# Altium footprint library AD常用3D封装.PCBLIB: 342 footprints (part 16 of 22)
Each footprint in its own frame and in the unit in brackets; x right, y up, seen from the top. Pads: shape width x height; smd on the part's side, far side on the other; paste and mask are expansions set on the pad; w line width, h text height; cw(c..) or ccw(c..) is an arc to the next point about the centre after c.
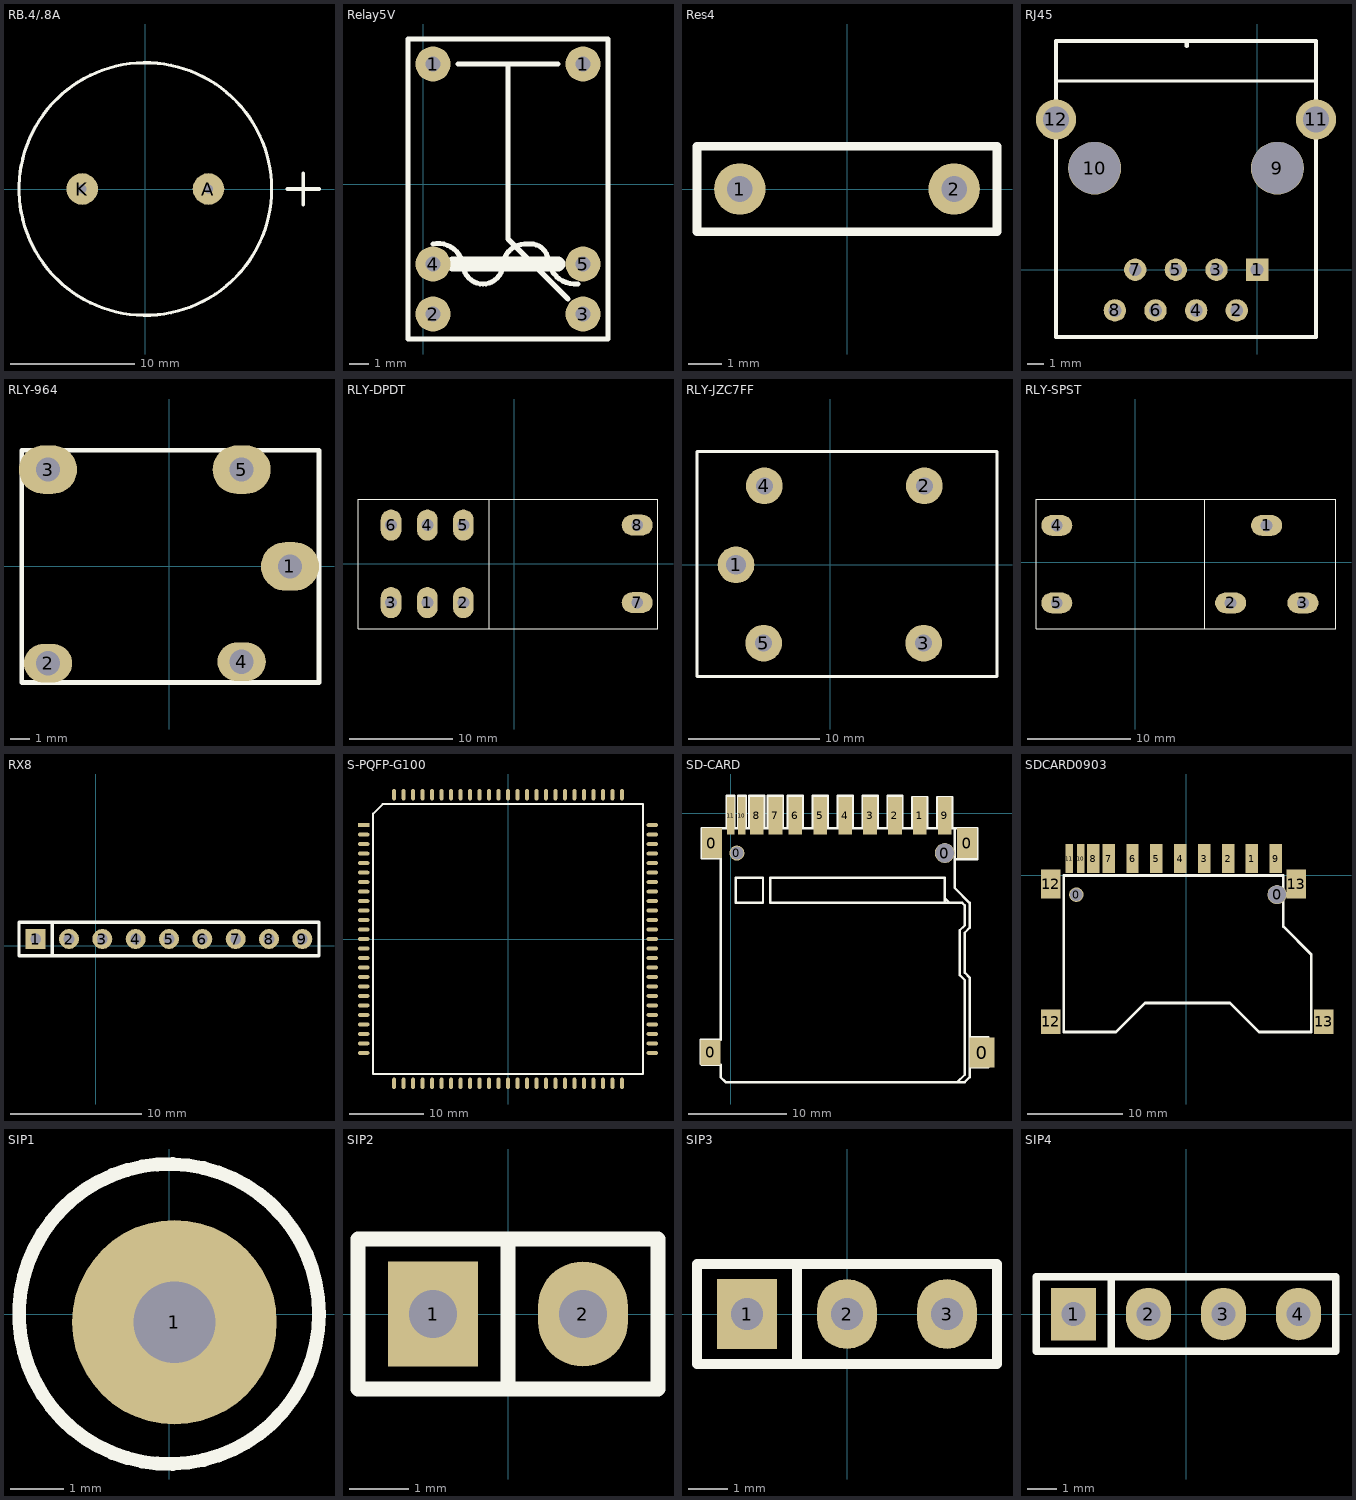
[diagram p15: the footprints below, top view; thin cyan lines are the x and y axes]

## RB.4/.8A [mil]
pads (2):
  round 100 hole 28: A(200,0) K(-200,0)
TopOverlay:
  circle w10: c0,0 r400
  lines w12: 450,0 550,0 ; 500,-50 500,50

## Relay5V [mil]
pads (6):
  round 70 hole 30: 1(20,240) 1(320,240) 2(20,-260) 3(320,-260) 4(20,-160) 5(320,-160)
TopOverlay:
  lines w10: 20,-120 cw(c30,-170) 80,-160 ccw(c120,-160) 120,-200 ccw(c120,-160) 160,-160 cw(c205,-165) 210,-120 cw(c215,-155) 250,-150 ccw(c305,-145) 310,-200 ; 70,240 270,240 ; 170,240 170,-110 290,-230 ; -30,-310 370,-310 370,290 -30,290 -30,-310
  lines w30: 60,-160 270,-160

## Res4 [mil]
pads (2):
  round 60 hole 30: 1(-125,0) 2(125,0)
TopOverlay:
  lines w10: -175,-50 -175,50 175,50 175,-50 -175,-50
3D body: height 79.62, standoff -74.8, extent -134.99,-36.23 135,36.24

## RJ45 [mil]
pads (12):
  rect 55x55 hole 31.5: 1(0,0)
  round 55 hole 31.5: 2(-50,-100) 3(-100,0) 4(-150,-100) 5(-200,0) 6(-250,-100) 7(-300,0) 8(-350,-100)
  round 130 hole 127.95 unplated: 9(50,250) 10(-400,250)
  round 98.42 hole 62.99: 11(145,370) 12(-495,370)
TopOverlay:
  lines w8: -488.19,464.57 141.73,464.57
  lines w10: -495,-165.35 144.65,-165.35 145,-165 145,370 145,562.99 -495,562.99 -495,370 -495,-165 ; -173.23,551.18 -173.23,559.06
3D body: height 127.85, standoff -555.12, extent -490,-172.17 139.92,556.17

## RLY-964 [mil]
pads (5):
  oval 120x100 hole 50: 1(250,0) 3(-250,200) 5(150,200)
  oval 100x80 hole 50: 2(-250,-200) 4(150,-196.85)
TopOverlay:
  lines w10: -304.17,-240 310,-240 310,0 310,240 -304.17,240 -304.17,-240

## RLY-DPDT [mil]
pads (8):
  oval 79x118 hole 45: 1(-330.5,-147.5) 2(-193.5,-147.5) 3(-468.5,-147.5) 4(-330.5,147.5) 5(-193.5,147.5) 6(-468.5,147.5)
  oval 118x79 hole 45: 7(468.5,-147.5) 8(468.5,147.5)
TopOverlay:
  lines w4: -94.5,-246.5 -94.5,245.5 ; -594.5,-246.5 547.5,-246.5 547.5,245.5 -594.5,245.5 -594.5,-246.5

## RLY-JZC7FF [mm]
pads (5):
  round 2.8 hole 1.5: 1(-7.175,-0.025)
  round 2.8 hole 1.3: 2(7.175,5.994) 3(7.125,-5.994) 4(-5.016,5.994) 5(-5.067,-5.994)
TopOverlay:
  lines w0.254: -10.147,-8.534 -10.147,8.611 12.713,8.611 12.713,-8.534 -10.147,-8.534

## RLY-SPST [mil]
pads (5):
  oval 118x79 hole 45: 1(500,140) 2(363,-155) 3(638,-155) 4(-299,140) 5(-299,-155)
TopOverlay:
  lines w4: 264,-253 264,239 ; -378,-253 -378,239 764,239 764,-253 -378,-253

## RX8 [mil]
pads (9):
  rect 60x60 hole 32: 1(-180,20)
  round 60 hole 32: 2(-80,20) 3(20,20) 4(120,20) 5(220,20) 6(320,20) 7(420,20) 8(520,20) 9(620,20)
TopOverlay:
  lines w10: -130,-30 -130,70 ; -230,-30 670,-30 670,70 -230,70 -230,-30
3D body: height 200.79, standoff -133.86, extent -225.91,-4.21 659.91,45

## S-PQFP-G100 [mil]
pads (100):
  rect 60x20 smd: 1(-760,600)
  oval 60x20 smd: 2(-760,550) 3(-760,500) 4(-760,450) 5(-760,400) 6(-760,350) 7(-760,300) 8(-760,250) 9(-760,200) 10(-760,150) 11(-760,100) 12(-760,50) 13(-760,0) 14(-760,-50) 15(-760,-100) 16(-760,-150) 17(-760,-200) 18(-760,-250) 19(-760,-300) 20(-760,-350) 21(-760,-400) 22(-760,-450) 23(-760,-500) 24(-760,-550) 25(-760,-600) 51(760,-600) 52(760,-550) 53(760,-500) 54(760,-450) 55(760,-400) 56(760,-350) 57(760,-300) 58(760,-250) 59(760,-200) 60(760,-150) 61(760,-100) 62(760,-50) 63(760,0) 64(760,50) 65(760,100) 66(760,150) 67(760,200) 68(760,250) 69(760,300) 70(760,350) 71(760,400) 72(760,450) 73(760,500) 74(760,550) 75(760,600)
  oval 20x60 smd: 26(-600,-760) 27(-550,-760) 28(-500,-760) 29(-450,-760) 30(-400,-760) 31(-350,-760) 32(-300,-760) 33(-250,-760) 34(-200,-760) 35(-150,-760) 36(-100,-760) 37(-50,-760) 38(0,-760) 39(50,-760) 40(100,-760) 41(150,-760) 42(200,-760) 43(250,-760) 44(300,-760) 45(350,-760) 46(400,-760) 47(450,-760) 48(500,-760) 49(550,-760) 50(600,-760) 76(600,760) 77(550,760) 78(500,760) 79(450,760) 80(400,760) 81(350,760) 82(300,760) 83(250,760) 84(200,760) 85(150,760) 86(100,760) 87(50,760) 88(0,760) 89(-50,760) 90(-100,760) 91(-150,760) 92(-200,760) 93(-250,760) 94(-300,760) 95(-350,760) 96(-400,760) 97(-450,760) 98(-500,760) 99(-550,760) 100(-600,760)
TopOverlay:
  lines w10: -710,-710 710,-710 710,710 -660,710 -710,660 -710,-710
3D body: height 102.36, standoff 0, extent -297.84,-281.84 277.84,293.84

## SD-CARD [mil] "SD插座1"
pads (17):
  rect 80x100 smd: 0(-80,-960)
  rect 80x120 smd: 0(-75,-120) 0(950,-120)
  round 60 hole 52: 0(25,-160)
  round 80 hole 75: 0(860,-160)
  rect 100x120 smd: 0(1009.63,-960.84)
  rect 55x150 smd: 1(760,-10) 2(660,-10) 3(560,-10) 4(460,-10) 5(360,-10) 6(260,-10) 7(180,-10) 8(105,-10) 9(860,-10)
  rect 30x150 smd: 10(45,-10) 11(0,-10)
TopOverlay:
  lines w10: -15,-60 -15,70 15,70 15,-60 -40,-60 -115,-60 -115,-180 -40,-180 -40,-910 -120,-910 -120,-1005 -115,-1010 -40,-1010 -40,-1060 -20,-1080 -10,-1080 940,-1080 960,-1060 960,-660 940,-640 940,-480 960,-460 960,-450 960,-380 960,-360 900,-300 900,-70 900,-60 ; 10,-60 900,-60 ; 30,-60 30,70 60,70 60,-60 ; 75,-55 75,70 135,70 135,-55 ; 110,-360 130,-360 130,-260 20,-260 20,-360 120,-360 ; 150,-55 150,70 210,70 210,-55 ; 230,-55 230,70 290,70 290,-55 ; 330,-55 330,70 390,70 390,-55 ; 430,-55 430,70 490,70 490,-55 ; 530,-55 530,70 590,70 590,-55 ; 630,-55 630,70 690,70 690,-55 ; 730,-60 730,65 790,65 790,-60 ; 830,-60 830,65 890,65 890,-60 ; 860,-340 880,-360 ; 900,-185 990,-185 990,-60 900,-60 ; 910,-1080 940,-1050 940,-680 940,-670 920,-650 920,-470 940,-450 940,-370 930,-360 860,-360 ; 960,-1020 1035,-1020 ; 960,-900 1035,-900 ; 860,-360 860,-350 860,-260 160,-260 160,-360 860,-360
3D body: height 114.17, standoff -21.65, extent -131,-1144.39 1050.1,56.39

## SDCARD0903 [mm] "SD卡插座0903"
pads (17):
  round 1.524 hole 1.321: 0(-11.5,-2)
  round 2 hole 1.9: 0(9.5,-2)
  rect 1.3x3 smd: 1(6.875,1.778) 2(4.375,1.778) 3(1.875,1.778) 4(-0.625,1.778) 5(-3.125,1.778) 6(-5.625,1.778) 7(-8.125,1.778) 8(-9.75,1.778) 9(9.375,1.778)
  rect 0.762x3 smd: 10(-11.05,1.778) 11(-12.25,1.778)
  rect 2.032x2.54 smd: 12(-14.2,-15.3) 13(14.4,-15.3)
  rect 2.032x3.048 smd: 12(-14.2,-0.9) 13(11.5,-0.9)
TopOverlay:
  lines w0.279: -12.827,-16.383 -7.366,-16.383 -4.318,-13.335 0,-13.335 4.572,-13.335 7.62,-16.383 13.081,-16.383 13.081,-8.255 10.16,-5.334 10.16,0 -12.827,0 -12.827,-16.383

## SIP1 [mil]
pads (1):
  round 150 hole 60: 1(4,-6)
TopOverlay:
  circle w10: c0,0 r110
3D body: height 336.22, standoff -118.11, extent -45,-55 55,45

## SIP2 [mil]
pads (2):
  rect 60x70 hole 32: 1(-50,0)
  oval 60x70 hole 32: 2(50,0)
TopOverlay:
  lines w10: 0,-50 0,50 ; -100,-50 -100,50 100,50 100,-50 -100,-50
3D body: height 336.22, standoff -118.11, extent -100,-50 100,50

## SIP3 [mil]
pads (3):
  rect 60x70 hole 32: 1(-100,0)
  oval 60x70 hole 32: 2(0,0) 3(100,0)
TopOverlay:
  lines w10: -50,-50 -50,50 ; -150,-50 -150,50 150,50 150,-50 -150,-50
3D body: height 336.22, standoff -118.11, extent -150,-51 150,49

## SIP4 [mil]
pads (4):
  rect 60x70 hole 32: 1(-150,0)
  oval 60x70 hole 32: 2(-50,0) 3(50,0) 4(150,0)
TopOverlay:
  lines w10: -100,-50 -100,50 ; -200,-50 -200,50 200,50 200,-50 -200,-50
3D body: height 336.22, standoff -118.11, extent -200,-50 200,50